# Altium footprint library IC_SMD_DUAL.PCBLIB: 176 footprints (part 6 of 11)
Each footprint in its own frame and in the unit in brackets; x right, y up, seen from the top. Pads: shape width x height; smd on the part's side, far side on the other; paste and mask are expansions set on the pad; w line width, h text height; cw(c..) or ccw(c..) is an arc to the next point about the centre after c.
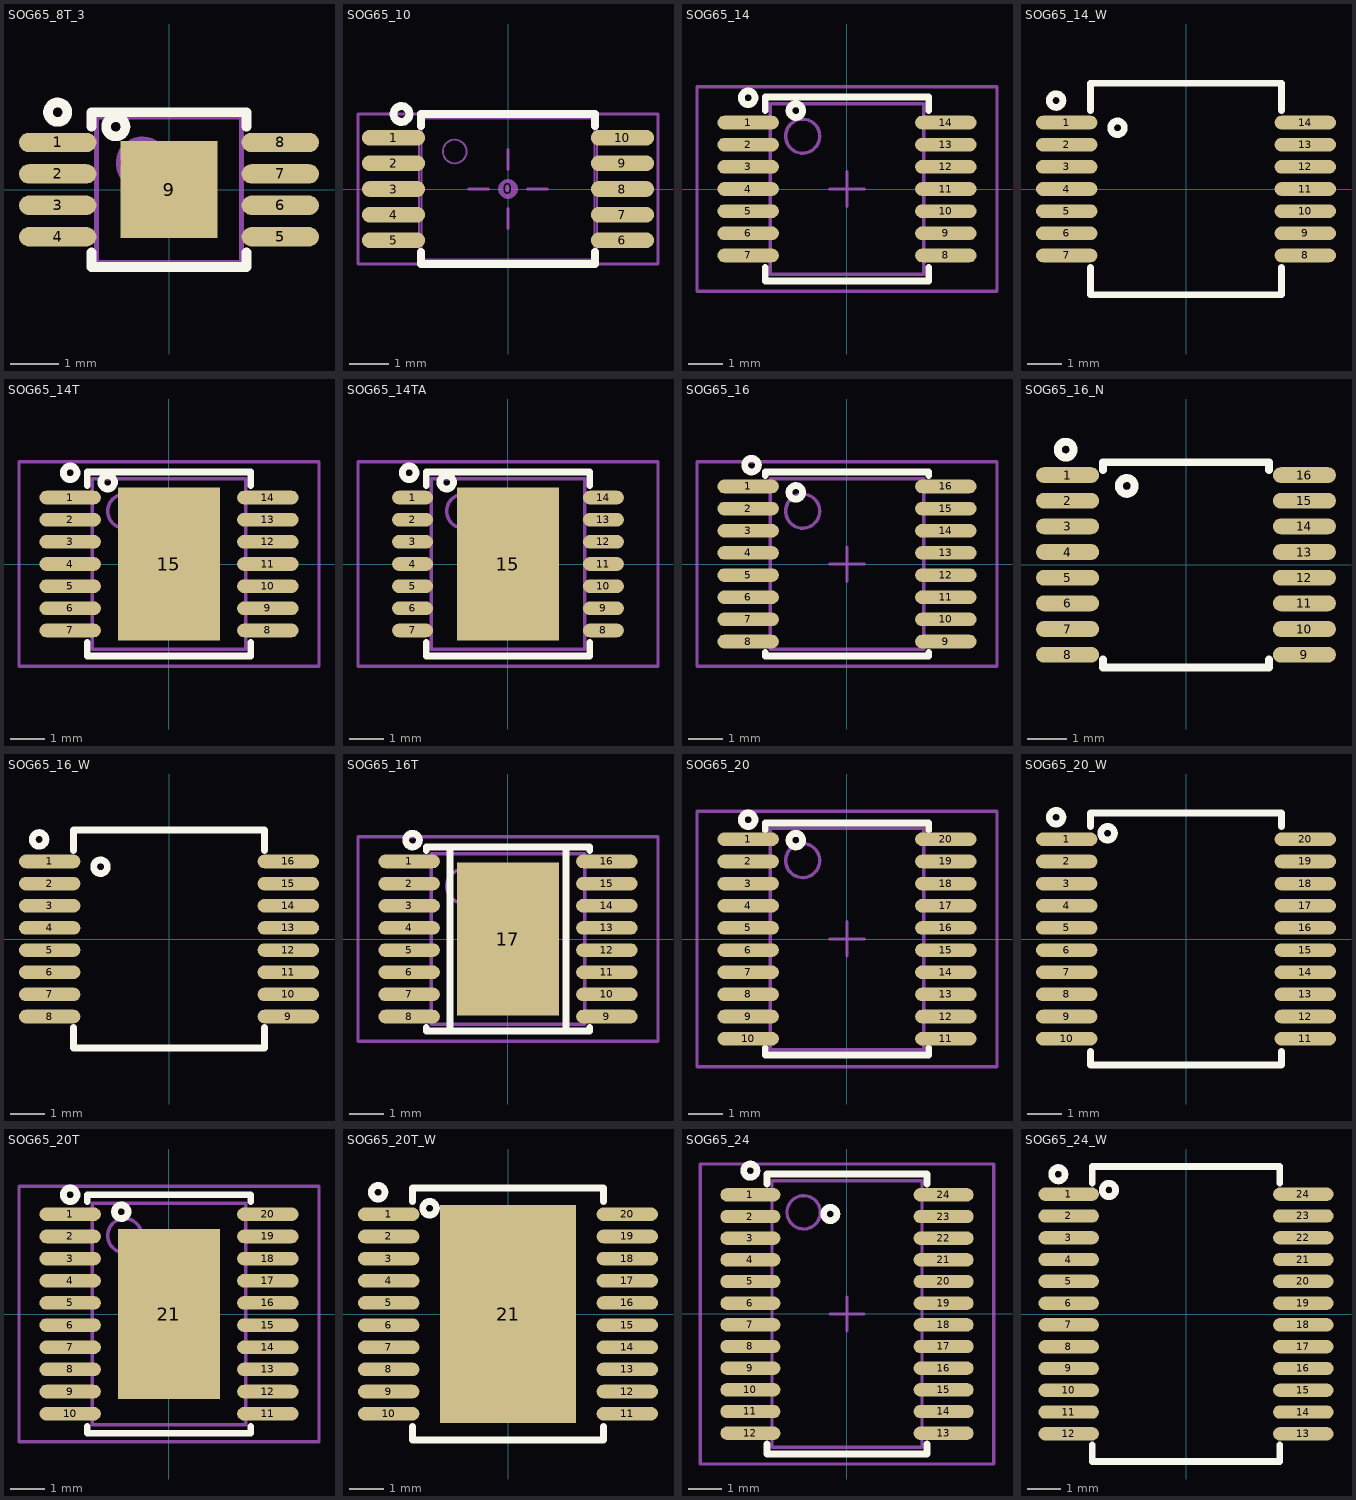
[diagram p5: the footprints below, top view; thin cyan lines are the x and y axes]

## SOG65_8T_3 [mm]
height 1.2
pads (9):
  oval 1.6x0.4 smd: 1(-2.3,0.975) 2(-2.3,0.325) 3(-2.3,-0.325) 4(-2.3,-0.975) 5(2.3,-0.975) 6(2.3,-0.325) 7(2.3,0.325) 8(2.3,0.975)
  rect 2x2 smd paste-5: 9(0,0)
TopOverlay:
  circle w0.2: c-2.3,1.6 r0.2
  circle w0.2: c-1.1,1.3 r0.2
  lines w0.2: -1.6,-1.3 -1.6,-1.6 1.6,-1.6 1.6,-1.3 ; -1.6,1.3 -1.6,1.6 1.6,1.6 1.6,1.3
TopPaste:
  rectangle: -0.9,0.2 -0.2,0.9
  region: 0.9,0.9 0.2,0.9 0.2,0.2 0.9,0.2
  region: 0.9,-0.2 0.2,-0.2 0.2,-0.9 0.9,-0.9
  rectangle: -0.9,-0.9 -0.2,-0.2
Mechanical13:
  circle w0.1: c-0.55,0.55 r0.5
  lines w0.1: -1.5,-1.5 -1.5,1.5 1.5,1.5 1.5,-1.5 -1.5,-1.5
3D body "User Library-MSOP-8-1.step": height 0.92, standoff 0, extent -2.5,-1.5 2.5,1.5

## SOG65_10 [mm] "TSSOP, 10 Leads, Body 3.7x4.4mm (max), Pitch 0.65mm"
height 1.2
pads (11):
  round 0.508 on Mech15: 0(0,0)
  oval 1.6x0.4 smd paste-0.05 mask+0.07: 1(-2.9,1.3) 2(-2.9,0.65) 3(-2.9,0) 4(-2.9,-0.65) 5(-2.9,-1.3) 6(2.9,-1.3) 7(2.9,-0.65) 8(2.9,0) 9(2.9,0.65) 10(2.9,1.3)
TopOverlay:
  circle w0.2: c-2.7,1.9 r0.2
  lines w0.2: -2.2,-1.6 -2.2,-1.9 2.2,-1.9 2.2,-1.6 ; -2.2,1.6 -2.2,1.9 2.2,1.9 2.2,1.6
Mechanical13:
  circle w0.05: c-1.35,0.95 r0.3
  lines w0.05: -2.839,-1.45 -2.839,-1.15 ; -2.839,-0.8 -2.839,-0.5 ; -2.839,-0.15 -2.839,0.15 ; -2.839,0.5 -2.839,0.8 ; -2.839,1.15 -2.839,1.45 ; -2.795,-1.45 -2.795,-1.15 ; -2.795,-0.8 -2.795,-0.5 ; -2.795,-0.15 -2.795,0.15 ; -2.795,0.5 -2.795,0.8 ; -2.795,1.15 -2.795,1.45 ; -2.693,-1.45 -2.693,-1.15 ; -2.693,-0.8 -2.693,-0.5 ; -2.693,-0.15 -2.693,0.15 ; -2.693,0.5 -2.693,0.8 ; -2.693,1.15 -2.693,1.45 ; -2.5,-1.45 -2.5,-1.15 ; -2.5,-0.8 -2.5,-0.5 ; -2.5,-0.15 -2.5,0.15 ; -2.5,0.5 -2.5,0.8 ; -2.5,1.15 -2.5,1.45 ; -2.25,-1.45 -3.25,-1.45 -3.25,-1.15 -2.25,-1.15 ; -2.25,-0.8 -3.25,-0.8 -3.25,-0.5 -2.25,-0.5 ; -2.25,-0.15 -3.25,-0.15 -3.25,0.15 -2.25,0.15 ; -2.25,0.5 -3.25,0.5 -3.25,0.8 -2.25,0.8 ; -2.25,1.15 -3.25,1.15 -3.25,1.45 -2.25,1.45 ; 2.25,-1.45 3.25,-1.45 3.25,-1.15 2.25,-1.15 ; 2.25,-0.8 3.25,-0.8 3.25,-0.5 2.25,-0.5 ; 2.25,-0.15 3.25,-0.15 3.25,0.15 2.25,0.15 ; 2.25,0.5 3.25,0.5 3.25,0.8 2.25,0.8 ; 2.25,1.15 3.25,1.15 3.25,1.45 2.25,1.45 ; 2.5,-1.45 2.5,-1.15 ; 2.5,-0.8 2.5,-0.5 ; 2.5,-0.15 2.5,0.15 ; 2.5,0.5 2.5,0.8 ; 2.5,1.15 2.5,1.45 ; 2.693,-1.45 2.693,-1.15 ; 2.693,-0.8 2.693,-0.5 ; 2.693,-0.15 2.693,0.15 ; 2.693,0.5 2.693,0.8 ; 2.693,1.15 2.693,1.45 ; 2.795,-1.45 2.795,-1.15 ; 2.795,-0.8 2.795,-0.5 ; 2.795,-0.15 2.795,0.15 ; 2.795,0.5 2.795,0.8 ; 2.795,1.15 2.795,1.45 ; 2.839,-1.45 2.839,-1.15 ; 2.839,-0.8 2.839,-0.5 ; 2.839,-0.15 2.839,0.15 ; 2.839,0.5 2.839,0.8 ; 2.839,1.15 2.839,1.45 ; -2.25,-1.85 -2.25,1.85 ; -2.25,-1.85 -2.187,-1.787 ; -2.25,-1.85 2.25,-1.85 ; -2.25,1.85 2.25,1.85 ; -2.25,1.85 -2.187,1.787 ; -2.187,-1.787 -2.187,1.787 ; -2.187,-1.787 2.187,-1.787 ; -2.187,1.787 2.187,1.787 ; 2.187,-1.787 2.187,1.787 ; 2.187,-1.787 2.25,-1.85 ; 2.187,1.787 2.25,1.85 ; 2.25,-1.85 2.25,1.85
Mechanical15:
  lines w0.076: -1,0 -0.5,0 ; 0,-1 0,-0.5 ; 0,0.5 0,1 ; 0.5,0 1,0 ; -3.8,-1.9 -3.8,1.9 3.8,1.9 3.8,-1.9 -3.8,-1.9
3D body "TSSOP65P640X120-10N.STEP": height 1.2, standoff 0, extent -3.25,-1.85 3.25,1.85

## SOG65_14 [mm] "PW TSSOP (TI), MO-153-AB (JEDEC), 14Lead, pitch: 0.65mm, 5x4.4x1.2mm"
height 1.2
pads (14):
  oval 1.8x0.4 smd mask+0.075: 1(-2.9,1.95) 2(-2.9,1.3) 3(-2.9,0.65) 4(-2.9,0) 5(-2.9,-0.65) 6(-2.9,-1.3) 7(-2.9,-1.95) 8(2.9,-1.95) 9(2.9,-1.3) 10(2.9,-0.65) 11(2.9,0) 12(2.9,0.65) 13(2.9,1.3) 14(2.9,1.95)
TopOverlay:
  circle w0.2: c-2.9,2.675 r0.2
  circle w0.2: c-1.5,2.3 r0.2
  lines w0.2: -2.4,-2.3 -2.4,-2.7 2.4,-2.7 2.4,-2.3 ; -2.4,2.3 -2.4,2.7 2.4,2.7 2.4,2.3
Mechanical13:
  circle w0.1: c-1.3,1.55 r0.5
  lines w0.1: -2.25,-2.5 -2.25,2.5 2.25,2.5 2.25,-2.5 -2.25,-2.5
Mechanical15:
  lines w0.1: -0.5,0 0.5,0 ; 0,-0.5 0,0.5 ; -4.4,-3 -4.4,3 4.4,3 4.4,-3 -4.4,-3
3D body "User Library-TSSOP14-1.step": height 1.1, standoff 0, extent -3.2,-2.5 3.2,2.5

## SOG65_14_W [mm] "SSOP 5.3mm Width 0.65mm pitch, SOT337-1, SOT402-1, MO-150AB(JEDEC),"
pads (14):
  oval 1.8x0.4 smd mask+0.075: 1(-3.5,1.95) 2(-3.5,1.3) 3(-3.5,0.65) 4(-3.5,0) 5(-3.5,-0.65) 6(-3.5,-1.3) 7(-3.5,-1.95) 8(3.5,-1.95) 9(3.5,-1.3) 10(3.5,-0.65) 11(3.5,0) 12(3.5,0.65) 13(3.5,1.3) 14(3.5,1.95)
TopOverlay:
  circle w0.2: c-3.81,2.595 r0.2
  circle w0.2: c-2.01,1.795 r0.2
  lines w0.2: -2.8,-2.3 -2.8,-3.1 2.8,-3.1 2.8,-2.3 ; -2.8,2.3 -2.8,3.1 2.8,3.1 2.8,2.3
3D body "SOG65_14_W-.step": height 2, standoff 0, extent -3.9,-3.25 3.9,3.25

## SOG65_14T [mm] "TSSOP 4.4mm, PWP, MO-153-ABT , 14Lead, pitch: 0.65mm, 5x4.4x1.2mm"
height 1.2
pads (15):
  oval 1.8x0.4 smd mask+0.075: 1(-2.9,1.95) 2(-2.9,1.3) 3(-2.9,0.65) 4(-2.9,0) 5(-2.9,-0.65) 6(-2.9,-1.3) 7(-2.9,-1.95) 8(2.9,-1.95) 9(2.9,-1.3) 10(2.9,-0.65) 11(2.9,0) 12(2.9,0.65) 13(2.9,1.3) 14(2.9,1.95)
  rect 3x4.5 smd paste-5 mask+0.1: 15(0,0)
TopOverlay:
  circle w0.2: c-2.9,2.675 r0.2
  circle w0.2: c-1.8,2.4 r0.2
  lines w0.2: -2.4,-2.3 -2.4,-2.7 2.4,-2.7 2.4,-2.3 ; -2.4,2.3 -2.4,2.7 2.4,2.7 2.4,2.3
TopPaste:
  rectangle: -1.3,-2 -0.2,-0.2
  region: 1.3,-0.2 0.2,-0.2 0.2,-2 1.3,-2
  region: 1.3,2 0.2,2 0.2,0.2 1.3,0.2
  rectangle: -1.3,0.2 -0.2,2
Mechanical13:
  circle w0.1: c-1.3,1.55 r0.5
  lines w0.1: -2.25,-2.5 -2.25,2.5 2.25,2.5 2.25,-2.5 -2.25,-2.5
Mechanical15:
  lines w0.1: -0.5,0 0.5,0 ; 0,-0.5 0,0.5 ; -4.4,-3 -4.4,3 4.4,3 4.4,-3 -4.4,-3
3D body "User Library-TSSOP14-1.step": height 1.1, standoff 0, extent -3.2,-2.5 3.2,2.5

## SOG65_14TA [mm] "TSSOP 4.4mm, PWP, MO-153-ABT , 14Lead, pitch: 0.65mm, 5x4.4x1.2mm"
height 1.2
pads (15):
  oval 1.2x0.4 smd mask+0.075: 1(-2.8,1.95) 2(-2.8,1.3) 3(-2.8,0.65) 4(-2.8,0) 5(-2.8,-0.65) 6(-2.8,-1.3) 7(-2.8,-1.95) 8(2.8,-1.95) 9(2.8,-1.3) 10(2.8,-0.65) 11(2.8,0) 12(2.8,0.65) 13(2.8,1.3) 14(2.8,1.95)
  rect 3x4.5 smd paste-5 mask+0.1: 15(0,0)
TopOverlay:
  circle w0.2: c-2.9,2.675 r0.2
  circle w0.2: c-1.8,2.4 r0.2
  lines w0.2: -2.4,-2.3 -2.4,-2.7 2.4,-2.7 2.4,-2.3 ; -2.4,2.3 -2.4,2.7 2.4,2.7 2.4,2.3
TopPaste:
  rectangle: -1.3,-2 -0.2,-0.2
  region: 1.3,-0.2 0.2,-0.2 0.2,-2 1.3,-2
  region: 1.3,2 0.2,2 0.2,0.2 1.3,0.2
  rectangle: -1.3,0.2 -0.2,2
Mechanical13:
  circle w0.1: c-1.3,1.55 r0.5
  lines w0.1: -2.25,-2.5 -2.25,2.5 2.25,2.5 2.25,-2.5 -2.25,-2.5
Mechanical15:
  lines w0.1: -0.5,0 0.5,0 ; 0,-0.5 0,0.5 ; -4.4,-3 -4.4,3 4.4,3 4.4,-3 -4.4,-3
3D body "User Library-TSSOP14-1.step": height 1.1, standoff 0, extent -3.2,-2.5 3.2,2.5

## SOG65_16 [mm] "PW TSSOP (TI), MO-153-AB (JEDEC), 16Lead, pitch: 0.65mm, 5x4.4x1.2mm"
height 1.2
pads (16):
  oval 1.8x0.4 smd mask+0.075: 1(-2.9,2.275) 2(-2.9,1.625) 3(-2.9,0.975) 4(-2.9,0.325) 5(-2.9,-0.325) 6(-2.9,-0.975) 7(-2.9,-1.625) 8(-2.9,-2.275) 9(2.9,-2.275) 10(2.9,-1.625) 11(2.9,-0.975) 12(2.9,-0.325) 13(2.9,0.325) 14(2.9,0.975) 15(2.9,1.625) 16(2.9,2.275)
TopOverlay:
  circle w0.2: c-1.5,2.1 r0.2
  circle w0.2: c-2.8,2.9 r0.2
  lines w0.2: -2.4,-2.6 -2.4,-2.7 2.4,-2.7 2.4,-2.6 ; -2.4,2.6 -2.4,2.7 2.4,2.7 2.4,2.6
Mechanical13:
  circle w0.1: c-1.3,1.55 r0.5
  lines w0.1: -2.25,-2.5 2.25,-2.5 2.25,2.5 -2.25,2.5 -2.25,-2.5
Mechanical15:
  lines w0.1: -0.5,0 0.5,0 ; 0,-0.5 0,0.5 ; -4.4,-3 4.4,-3 4.4,3 -4.4,3 -4.4,-3
3D body "User Library-TSSOP-16-1.step": height 1.1, standoff 0, extent -3.2,-2.5 3.2,2.5

## SOG65_16_N [mm] "SSOP, 4mm width"
pads (16):
  oval 1.6x0.4 smd: 1(-3,2.275) 2(-3,1.625) 3(-3,0.975) 4(-3,0.325) 5(-3,-0.325) 6(-3,-0.975) 7(-3,-1.625) 8(-3,-2.275) 9(3,-2.275) 10(3,-1.625) 11(3,-0.975) 12(3,-0.325) 13(3,0.325) 14(3,0.975) 15(3,1.625) 16(3,2.275)
TopOverlay:
  circle w0.2: c-1.5,2 r0.2
  circle w0.2: c-3.048,2.92 r0.2
  lines w0.2: -2.1,-2.4 -2.1,-2.6 2.1,-2.6 2.1,-2.4 ; -2.1,2.4 -2.1,2.6 2.1,2.6 2.1,2.4
3D body "User Library-MAX_QSOP16.step": height 1.76, standoff -0.01, extent -3.01,-2.49 3.01,2.49

## SOG65_16_W [mm] "SSOP16, SOT338-1, SOT403-1, RU-16, pitch: 0.65mm, 6x5.3mm, GN16, MO-150AC"
pads (16):
  oval 1.8x0.4 smd mask+0.075: 1(-3.5,2.275) 2(-3.5,1.625) 3(-3.5,0.975) 4(-3.5,0.325) 5(-3.5,-0.325) 6(-3.5,-0.975) 7(-3.5,-1.625) 8(-3.5,-2.275) 9(3.5,-2.275) 10(3.5,-1.625) 11(3.5,-0.975) 12(3.5,-0.325) 13(3.5,0.325) 14(3.5,0.975) 15(3.5,1.625) 16(3.5,2.275)
TopOverlay:
  circle w0.2: c-2.01,2.12 r0.2
  circle w0.2: c-3.81,2.92 r0.2
  lines w0.2: -2.8,-2.6 -2.8,-3.2 2.8,-3.2 2.8,-2.6 ; -2.8,2.6 -2.8,3.2 2.8,3.2 2.8,2.6
3D body "User Library-SSOP-16.STEP": height 1.9, standoff 0, extent -3.9,-3.1 3.9,3.1

## SOG65_16T [mm] "TSSOP 4.4mm(MAXIM), MO-153-ABT (JEDEC), 16Lead, pitch: 0.65mm, 5x4.4x1.2mm"
height 1.2
pads (17):
  oval 1.8x0.4 smd mask+0.075: 1(-2.9,2.275) 2(-2.9,1.625) 3(-2.9,0.975) 4(-2.9,0.325) 5(-2.9,-0.325) 6(-2.9,-0.975) 7(-2.9,-1.625) 8(-2.9,-2.275) 9(2.9,-2.275) 10(2.9,-1.625) 11(2.9,-0.975) 12(2.9,-0.325) 13(2.9,0.325) 14(2.9,0.975) 15(2.9,1.625) 16(2.9,2.275)
  rect 3x4.5 smd paste-5 mask+0.1: 17(0,0)
TopOverlay:
  circle w0.2: c-2.8,2.9 r0.2
  lines w0.2: -2.4,-2.6 -2.4,-2.7 2.4,-2.7 2.4,-2.6 ; -2.4,2.6 -2.4,2.7 2.4,2.7 2.4,2.6 ; -1.7,-2.7 -1.7,2.7 ; 1.7,-2.7 1.7,2.7
TopPaste:
  rectangle: -1.3,-2 -0.2,-0.2
  region: 1.3,-0.2 0.2,-0.2 0.2,-2 1.3,-2
  region: 1.3,2 0.2,2 0.2,0.2 1.3,0.2
  rectangle: -1.3,0.2 -0.2,2
Mechanical13:
  circle w0.1: c-1.3,1.55 r0.5
  lines w0.1: -2.25,-2.5 -2.25,2.5 2.25,2.5 2.25,-2.5 -2.25,-2.5
Mechanical15:
  lines w0.1: -0.5,0 0.5,0 ; 0,-0.5 0,0.5 ; -4.4,-3 -4.4,3 4.4,3 4.4,-3 -4.4,-3
3D body "User Library-TSSOP-16-1.step": height 1.1, standoff 0, extent -3.2,-2.5 3.2,2.5

## SOG65_20 [mm] "PW TSSOP (TI), MO-153-AC (JEDEC), 20Lead, pitch: 0.65mm, 6.5x4.4x1.2mm"
height 1.2
pads (20):
  oval 1.8x0.4 smd mask+0.075: 1(-2.9,2.925) 2(-2.9,2.275) 3(-2.9,1.625) 4(-2.9,0.975) 5(-2.9,0.325) 6(-2.9,-0.325) 7(-2.9,-0.975) 8(-2.9,-1.625) 9(-2.9,-2.275) 10(-2.9,-2.925) 11(2.9,-2.925) 12(2.9,-2.275) 13(2.9,-1.625) 14(2.9,-0.975) 15(2.9,-0.325) 16(2.9,0.325) 17(2.9,0.975) 18(2.9,1.625) 19(2.9,2.275) 20(2.9,2.925)
TopOverlay:
  circle w0.2: c-1.5,2.9 r0.2
  circle w0.2: c-2.9,3.5 r0.2
  lines w0.2: -2.4,-3.2 -2.4,-3.4 2.4,-3.4 2.4,-3.2 ; -2.4,3.2 -2.4,3.4 2.4,3.4 2.4,3.2
Mechanical13:
  circle w0.1: c-1.3,2.3 r0.5
  lines w0.1: -2.25,-3.25 2.25,-3.25 2.25,3.25 -2.25,3.25 -2.25,-3.25
Mechanical15:
  lines w0.1: -0.5,0 0.5,0 ; 0,-0.5 0,0.5 ; -4.4,-3.75 4.4,-3.75 4.4,3.75 -4.4,3.75 -4.4,-3.75
3D body "User Library-TSSOP-20-2.STEP": height 1.2, standoff 0, extent -3.2,-3.25 3.2,3.25

## SOG65_20_W [mm] "SSOP20, TSSOP20, RU-20, RQ-20, DB, pitch: 0.65mm, 7X5.3mm, QSP, SOT339-1, SOT266-1, AT-260, TSSO6X6-G20, NP20, MO-153AC, MO-150AE, MO-137-AD, MO-152"
pads (20):
  oval 1.8x0.4 smd mask+0.075: 1(-3.5,2.925) 2(-3.5,2.275) 3(-3.5,1.625) 4(-3.5,0.975) 5(-3.5,0.325) 6(-3.5,-0.325) 7(-3.5,-0.975) 8(-3.5,-1.625) 9(-3.5,-2.275) 10(-3.5,-2.925) 11(3.5,-2.925) 12(3.5,-2.275) 13(3.5,-1.625) 14(3.5,-0.975) 15(3.5,-0.325) 16(3.5,0.325) 17(3.5,0.975) 18(3.5,1.625) 19(3.5,2.275) 20(3.5,2.925)
TopOverlay:
  circle w0.2: c-3.81,3.57 r0.2
  circle w0.2: c-2.3,3.1 r0.2
  lines w0.2: -2.8,-3.3 -2.8,-3.7 2.8,-3.7 2.8,-3.3 ; -2.8,3.3 -2.8,3.7 2.8,3.7 2.8,3.3
3D body "User Library-SSOP 20 PIN-1.step": height 1.98, standoff -0.01, extent -3.95,-3.665 3.95,3.665

## SOG65_20T [mm] "TSSOP 4.4mm(MAXIM), MO-153-ACT (JEDEC), 20Lead, pitch: 0.65mm, 6.5x4.4x1.2mm"
height 1.2
pads (21):
  oval 1.8x0.4 smd mask+0.075: 1(-2.9,2.925) 2(-2.9,2.275) 3(-2.9,1.625) 4(-2.9,0.975) 5(-2.9,0.325) 6(-2.9,-0.325) 7(-2.9,-0.975) 8(-2.9,-1.625) 9(-2.9,-2.275) 10(-2.9,-2.925) 11(2.9,-2.925) 12(2.9,-2.275) 13(2.9,-1.625) 14(2.9,-0.975) 15(2.9,-0.325) 16(2.9,0.325) 17(2.9,0.975) 18(2.9,1.625) 19(2.9,2.275) 20(2.9,2.925)
  rect 3x5 smd paste-5 mask+0.1: 21(0,0)
TopOverlay:
  circle w0.2: c-2.9,3.5 r0.2
  circle w0.2: c-1.4,3 r0.2
  lines w0.2: -2.4,-3.3 -2.4,-3.5 2.4,-3.5 2.4,-3.3 ; -2.4,3.3 -2.4,3.5 2.4,3.5 2.4,3.3
TopPaste:
  region: 1.3,2.3 0.2,2.3 0.2,0.2 1.3,0.2
  rectangle: -1.3,0.2 -0.2,2.3
  rectangle: -1.3,-2.3 -0.2,-0.2
  region: 1.3,-0.2 0.2,-0.2 0.2,-2.3 1.3,-2.3
Mechanical13:
  circle w0.1: c-1.3,2.3 r0.5
  lines w0.1: -2.25,-3.25 2.25,-3.25 2.25,3.25 -2.25,3.25 -2.25,-3.25
Mechanical15:
  lines w0.1: -0.5,0 0.5,0 ; 0,-0.5 0,0.5 ; -4.4,-3.75 4.4,-3.75 4.4,3.75 -4.4,3.75 -4.4,-3.75
3D body "User Library-TSSOP-20-2.STEP": height 1.2, standoff 0, extent -3.2,-3.25 3.2,3.25

## SOG65_20T_W [mm] "TSSOP20P, PWP, pitch: 0.65mm, 7X5.3mm, MO-153"
pads (21):
  oval 1.8x0.4 smd mask+0.075: 1(-3.5,2.925) 2(-3.5,2.275) 3(-3.5,1.625) 4(-3.5,0.975) 5(-3.5,0.325) 6(-3.5,-0.325) 7(-3.5,-0.975) 8(-3.5,-1.625) 9(-3.5,-2.275) 10(-3.5,-2.925) 11(3.5,-2.925) 12(3.5,-2.275) 13(3.5,-1.625) 14(3.5,-0.975) 15(3.5,-0.325) 16(3.5,0.325) 17(3.5,0.975) 18(3.5,1.625) 19(3.5,2.275) 20(3.5,2.925)
  rect 4x6.4 smd paste-5 mask+0.075: 21(0,0)
TopOverlay:
  circle w0.2: c-3.81,3.57 r0.2
  circle w0.2: c-2.3,3.1 r0.2
  lines w0.2: -2.8,-3.3 -2.8,-3.7 2.8,-3.7 2.8,-3.3 ; -2.8,3.3 -2.8,3.7 2.8,3.7 2.8,3.3
TopPaste:
  rectangle: -1.8,0.2 -0.2,1.4
  rectangle: -1.8,1.8 -0.2,3
  region: 1.8,3 0.2,3 0.2,1.8 1.8,1.8
  region: 1.8,1.4 0.2,1.4 0.2,0.2 1.8,0.2
  region: 1.8,-0.2 0.2,-0.2 0.2,-1.4 1.8,-1.4
  region: 1.8,-1.8 0.2,-1.8 0.2,-3 1.8,-3
  rectangle: -1.8,-3 -0.2,-1.8
  rectangle: -1.8,-1.4 -0.2,-0.2
3D body "User Library-SSOP 20 PIN-1.step": height 1.98, standoff -0.01, extent -3.95,-3.665 3.95,3.665

## SOG65_24 [mm] "PW TSSOP (TI), MO-153-AD (JEDEC), 24Lead, pitch: 0.65mm, 8x4.4x1.2mm"
height 1.2
pads (24):
  oval 1.8x0.4 smd mask+0.075: 1(-2.9,3.575) 2(-2.9,2.925) 3(-2.9,2.275) 4(-2.9,1.625) 5(-2.9,0.975) 6(-2.9,0.325) 7(-2.9,-0.325) 8(-2.9,-0.975) 9(-2.9,-1.625) 10(-2.9,-2.275) 11(-2.9,-2.925) 12(-2.9,-3.575) 13(2.9,-3.575) 14(2.9,-2.925) 15(2.9,-2.275) 16(2.9,-1.625) 17(2.9,-0.975) 18(2.9,-0.325) 19(2.9,0.325) 20(2.9,0.975) 21(2.9,1.625) 22(2.9,2.275) 23(2.9,2.925) 24(2.9,3.575)
TopOverlay:
  circle w0.2: c-0.5,3 r0.2
  circle w0.2: c-2.9,4.3 r0.2
  lines w0.2: -2.4,-3.9 -2.4,-4.2 2.4,-4.2 2.4,-3.9 ; -2.4,3.9 -2.4,4.2 2.4,4.2 2.4,3.9
Mechanical13:
  circle w0.1: c-1.3,3.05 r0.5
  lines w0.1: -2.25,-4 2.25,-4 2.25,4 -2.25,4 -2.25,-4
Mechanical15:
  lines w0.1: -0.5,0 0.5,0 ; 0,-0.5 0,0.5 ; -4.4,-4.5 4.4,-4.5 4.4,4.5 -4.4,4.5 -4.4,-4.5
3D body "User Library-TSSOP-24.STEP": height 1.2, standoff 0, extent -3.2,-3.9 3.2,3.9

## SOG65_24_W [mm] "DB, SSOP24, TSSOP24, 0.65mm pitch, 5.3mm Width, SOT340-1, SOT355-1, MO-150AG, MO-153AD(JEDEC),"
pads (24):
  oval 1.8x0.4 smd mask+0.075: 1(-3.5,3.575) 2(-3.5,2.925) 3(-3.5,2.275) 4(-3.5,1.625) 5(-3.5,0.975) 6(-3.5,0.325) 7(-3.5,-0.325) 8(-3.5,-0.975) 9(-3.5,-1.625) 10(-3.5,-2.275) 11(-3.5,-2.925) 12(-3.5,-3.575) 13(3.5,-3.575) 14(3.5,-2.925) 15(3.5,-2.275) 16(3.5,-1.625) 17(3.5,-0.975) 18(3.5,-0.325) 19(3.5,0.325) 20(3.5,0.975) 21(3.5,1.625) 22(3.5,2.275) 23(3.5,2.925) 24(3.5,3.575)
TopOverlay:
  circle w0.2: c-3.81,4.17 r0.2
  circle w0.2: c-2.3,3.7 r0.2
  lines w0.2: -2.8,-3.9 -2.8,-4.4 2.8,-4.4 2.8,-3.9 ; -2.8,3.9 -2.8,4.4 2.8,4.4 2.8,3.9
3D body "User Library-SSOP 24 PIN_.step": height 1.98, standoff -0.01, extent -3.95,-4.315 3.95,4.315